# Altium footprint library Connector_PinHeader_1.00mm.PcbLib: 278 footprints (part 1 of 18)
Each footprint in its own frame and in the unit in brackets; x right, y up, seen from the top. Pads: shape width x height; smd on the part's side, far side on the other; paste and mask are expansions set on the pad; w line width, h text height; cw(c..) or ccw(c..) is an arc to the next point about the centre after c.
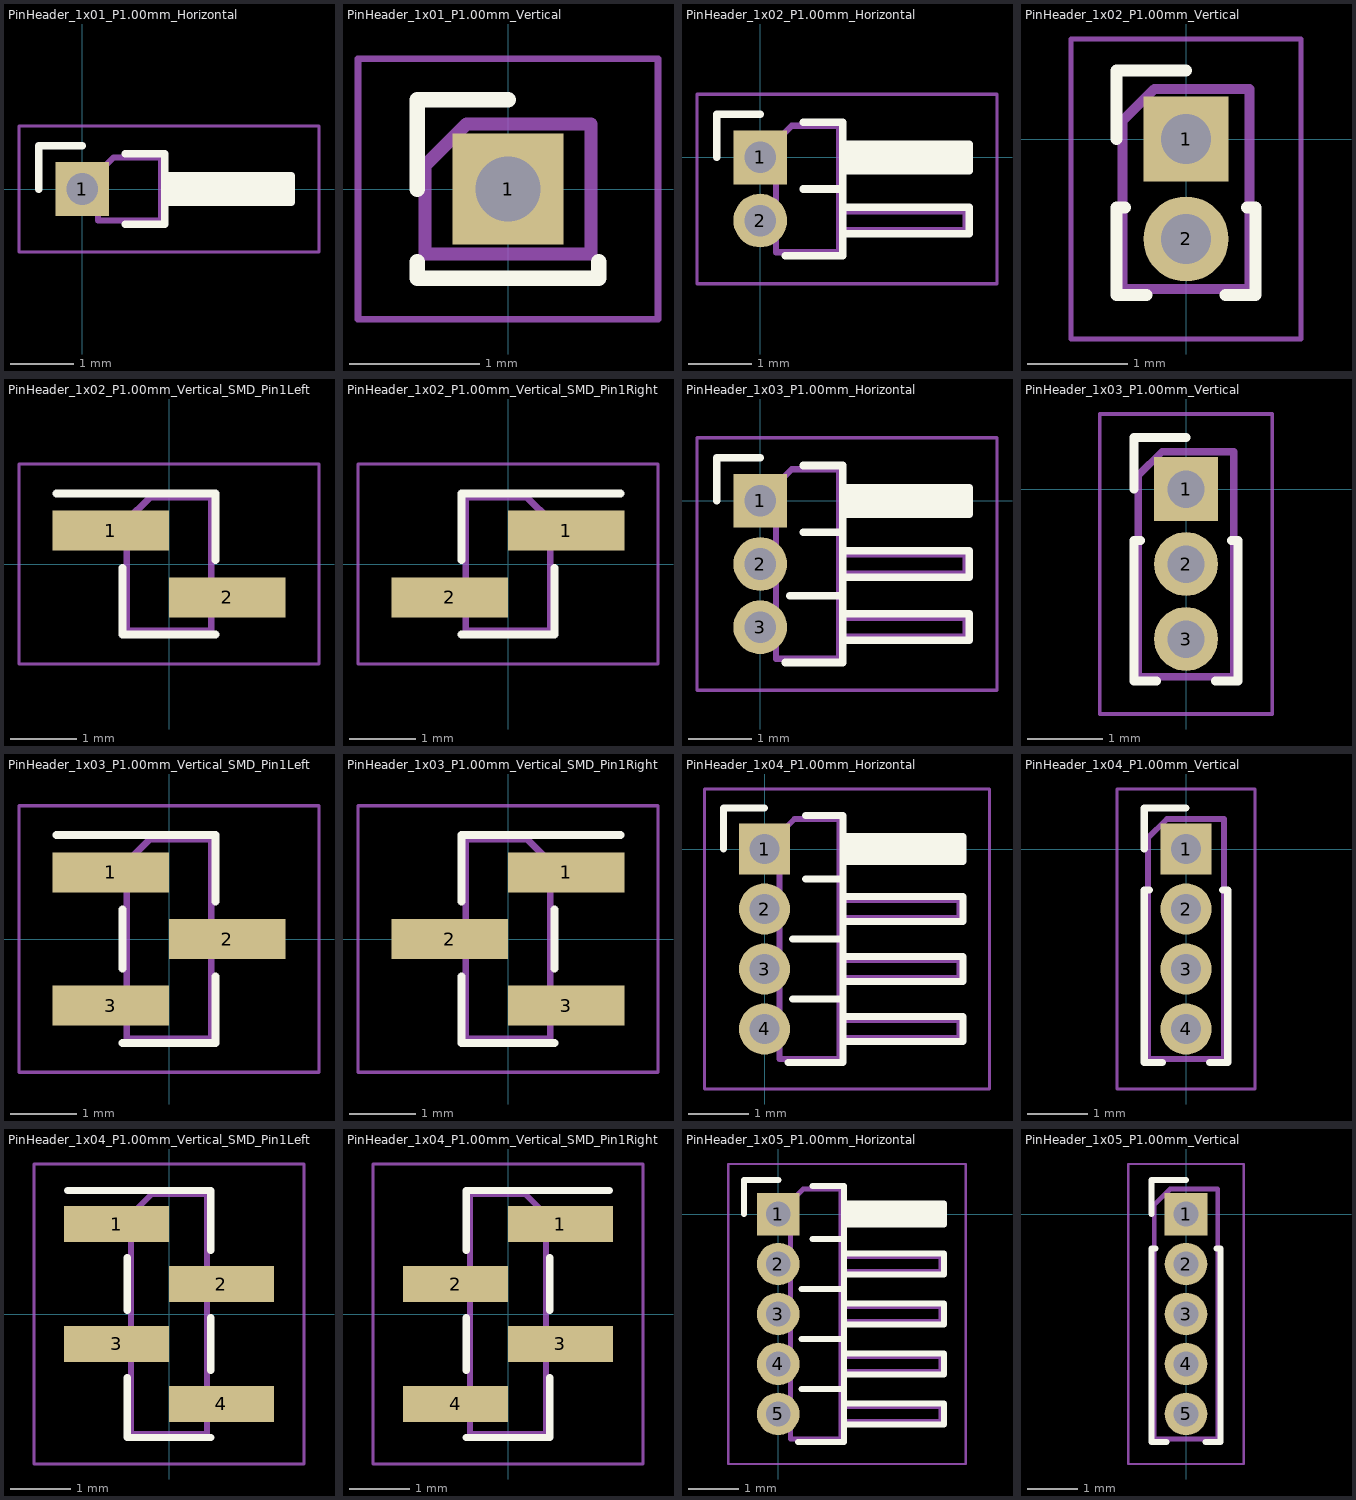
[diagram p0: the footprints below, top view; thin cyan lines are the x and y axes]

## PinHeader_1x01_P1.00mm_Horizontal [mm]
pads (1):
  rect 0.85x0.85 hole 0.5: 1(0,0)
F.SilkS:
  lines w0.12: -0.685,0 -0.685,0.685 0,0.685 ; 0.685,-0.56 1.31,-0.56 1.31,0.56 0.685,0.56 ; 1.31,-0.21 3.31,-0.21 3.31,0.21 1.31,0.21 ; 1.31,-0.09 3.31,-0.09 ; 1.31,0.03 3.31,0.03 ; 1.31,0.15 3.31,0.15
F.CrtYd:
  lines w0.05: -1,-1 -1,1 3.75,1 3.75,-1 -1,-1
F.Fab:
  lines w0.1: 0.25,-0.15 -0.15,-0.15 -0.15,0.15 0.25,0.15 ; 1.25,-0.15 3.25,-0.15 3.25,0.15 1.25,0.15 ; 0.25,-0.5 1.25,-0.5 1.25,0.5 0.5,0.5 0.25,0.25 0.25,-0.5
  text "'.Designator'" at 1.254,-2.428 h0.6

## PinHeader_1x01_P1.00mm_Vertical [mm]
pads (1):
  rect 0.85x0.85 hole 0.5: 1(0,0)
F.SilkS:
  lines w0.12: -0.695,-0.56 -0.695,-0.685 ; -0.695,0 -0.695,0.685 0,0.685 ; -0.608,-0.685 -0.695,-0.685 ; 0.608,-0.685 0.695,-0.685 ; 0.695,-0.56 0.695,-0.685 ; -0.695,-0.685 0.695,-0.685
F.CrtYd:
  lines w0.05: -1.15,-1 1.15,-1 1.15,1 -1.15,1 -1.15,-1
F.Fab:
  lines w0.1: -0.635,-0.5 -0.635,0.182 -0.318,0.5 0.635,0.5 0.635,-0.5 -0.635,-0.5
  text "'.Designator'" at 0.639,-3.076 h0.76

## PinHeader_1x02_P1.00mm_Horizontal [mm]
pads (2):
  rect 0.85x0.85 hole 0.5: 1(0,0)
  rrect100% 0.85x0.85 hole 0.5: 2(0,-1)
F.SilkS:
  lines w0.12: -0.685,0 -0.685,0.685 0,0.685 ; 0.394,-1.56 1.31,-1.56 1.31,0.56 0.685,0.56 ; 0.685,-0.5 1.31,-0.5 ; 1.31,-1.21 3.31,-1.21 3.31,-0.79 1.31,-0.79 ; 1.31,-0.21 3.31,-0.21 3.31,0.21 1.31,0.21 ; 1.31,-0.09 3.31,-0.09 ; 1.31,0.03 3.31,0.03 ; 1.31,0.15 3.31,0.15
F.CrtYd:
  lines w0.05: -1,-2 3.75,-2 3.75,1 -1,1 -1,-2
F.Fab:
  lines w0.1: 0.25,-1.15 -0.15,-1.15 -0.15,-0.85 0.25,-0.85 ; 0.25,-0.15 -0.15,-0.15 -0.15,0.15 0.25,0.15 ; 1.25,-1.15 3.25,-1.15 3.25,-0.85 1.25,-0.85 ; 1.25,-0.15 3.25,-0.15 3.25,0.15 1.25,0.15 ; 0.25,-1.5 1.25,-1.5 1.25,0.5 0.5,0.5 0.25,0.25 0.25,-1.5
  text "'.Designator'" at 1.254,-2.928 h0.6

## PinHeader_1x02_P1.00mm_Vertical [mm]
pads (2):
  rect 0.85x0.85 hole 0.5: 1(0,0)
  rrect100% 0.85x0.85 hole 0.5: 2(0,-1)
F.SilkS:
  lines w0.12: -0.695,0 -0.695,0.685 0,0.685 ; -0.608,-0.685 -0.695,-0.685 -0.695,-1.56 -0.394,-1.56 ; 0.394,-1.56 0.695,-1.56 0.695,-0.685 0.608,-0.685
F.CrtYd:
  lines w0.05: -1.15,-2 -1.15,1 1.15,1 1.15,-2 -1.15,-2
F.Fab:
  lines w0.1: -0.635,-1.5 0.635,-1.5 0.635,0.5 -0.318,0.5 -0.635,0.182 -0.635,-1.5
  text "'.Designator'" at 0.639,-3.576 h0.76

## PinHeader_1x02_P1.00mm_Vertical_SMD_Pin1Left [mm]
pads (2):
  rect 1.75x0.6 smd: 1(-0.875,0.5) 2(0.875,-0.5)
F.SilkS:
  lines w0.12: -1.69,1.06 -0.695,1.06 0.695,1.06 0.695,0.06 ; -0.695,-0.06 -0.695,-1.06 0.695,-1.06
F.CrtYd:
  lines w0.05: -2.25,-1.5 2.25,-1.5 2.25,1.5 -2.25,1.5 -2.25,-1.5
F.Fab:
  lines w0.1: -0.635,0.35 -1.25,0.35 -1.25,0.65 -0.635,0.65 ; 0.635,-0.65 1.25,-0.65 1.25,-0.35 0.635,-0.35 ; -0.635,0.65 -0.285,1 0.635,1 0.635,-1 -0.635,-1 -0.635,0.65
  text "'.Designator'" at 0.84,-4.047 h1

## PinHeader_1x02_P1.00mm_Vertical_SMD_Pin1Right [mm]
pads (2):
  rect 1.75x0.6 smd: 1(0.875,0.5) 2(-0.875,-0.5)
F.SilkS:
  lines w0.12: -0.695,-1.06 0.695,-1.06 0.695,-0.06 ; -0.695,0.94 -0.695,0.06 -0.695,1.06 0.695,1.06 1.69,1.06
F.CrtYd:
  lines w0.05: -2.25,-1.5 -2.25,1.5 2.25,1.5 2.25,-1.5 -2.25,-1.5
F.Fab:
  lines w0.1: -0.635,-0.65 -1.25,-0.65 -1.25,-0.35 -0.635,-0.35 ; 0.635,0.35 1.25,0.35 1.25,0.65 0.635,0.65 ; 0.635,0.65 0.635,-1 -0.635,-1 -0.635,1 0.285,1 0.635,0.65
  text "'.Designator'" at 0.84,-4.047 h1

## PinHeader_1x03_P1.00mm_Horizontal [mm]
pads (3):
  rect 0.85x0.85 hole 0.5: 1(0,0)
  rrect100% 0.85x0.85 hole 0.5: 2(0,-1) 3(0,-2)
F.SilkS:
  lines w0.12: -0.685,0 -0.685,0.685 0,0.685 ; 0.394,-2.56 1.31,-2.56 1.31,0.56 0.685,0.56 ; 0.468,-1.5 1.31,-1.5 ; 0.685,-0.5 1.31,-0.5 ; 1.31,-2.21 3.31,-2.21 3.31,-1.79 1.31,-1.79 ; 1.31,-1.21 3.31,-1.21 3.31,-0.79 1.31,-0.79 ; 1.31,-0.21 3.31,-0.21 3.31,0.21 1.31,0.21 ; 1.31,-0.09 3.31,-0.09 ; 1.31,0.03 3.31,0.03 ; 1.31,0.15 3.31,0.15
F.CrtYd:
  lines w0.05: -1,-3 3.75,-3 3.75,1 -1,1 -1,-3
F.Fab:
  lines w0.1: 0.25,-2.15 -0.15,-2.15 -0.15,-1.85 0.25,-1.85 ; 0.25,-1.15 -0.15,-1.15 -0.15,-0.85 0.25,-0.85 ; 0.25,-0.15 -0.15,-0.15 -0.15,0.15 0.25,0.15 ; 1.25,-2.15 3.25,-2.15 3.25,-1.85 1.25,-1.85 ; 1.25,-1.15 3.25,-1.15 3.25,-0.85 1.25,-0.85 ; 1.25,-0.15 3.25,-0.15 3.25,0.15 1.25,0.15 ; 0.25,-2.5 1.25,-2.5 1.25,0.5 0.5,0.5 0.25,0.25 0.25,-2.5
  text "'.Designator'" at 1.254,-3.428 h0.6

## PinHeader_1x03_P1.00mm_Vertical [mm]
pads (3):
  rect 0.85x0.85 hole 0.5: 1(0,0)
  rrect100% 0.85x0.85 hole 0.5: 2(0,-1) 3(0,-2)
F.SilkS:
  lines w0.12: -0.695,0 -0.695,0.685 0,0.685 ; -0.608,-0.685 -0.695,-0.685 -0.695,-2.56 -0.394,-2.56 ; 0.394,-2.56 0.695,-2.56 0.695,-0.685 0.608,-0.685
F.CrtYd:
  lines w0.05: -1.15,-3 -1.15,1 1.15,1 1.15,-3 -1.15,-3
F.Fab:
  lines w0.1: -0.635,-2.5 0.635,-2.5 0.635,0.5 -0.318,0.5 -0.635,0.182 -0.635,-2.5
  text "'.Designator'" at 0.639,-4.076 h0.76

## PinHeader_1x03_P1.00mm_Vertical_SMD_Pin1Left [mm]
pads (3):
  rect 1.75x0.6 smd: 1(-0.875,1) 2(0.875,0) 3(-0.875,-1)
F.SilkS:
  lines w0.12: -1.69,1.56 -0.695,1.56 0.695,1.56 0.695,0.56 ; -0.695,-1.56 0.695,-1.56 0.695,-0.56 ; -0.695,-0.44 -0.695,0.44
F.CrtYd:
  lines w0.05: -2.25,-2 -2.25,2 2.25,2 2.25,-2 -2.25,-2
F.Fab:
  lines w0.1: -0.635,-1.15 -1.25,-1.15 -1.25,-0.85 -0.635,-0.85 ; -0.635,0.85 -1.25,0.85 -1.25,1.15 -0.635,1.15 ; 0.635,-0.15 1.25,-0.15 1.25,0.15 0.635,0.15 ; -0.635,1.15 -0.635,-1.5 0.635,-1.5 0.635,1.5 -0.285,1.5 -0.635,1.15
  text "'.Designator'" at 0.84,-4.047 h1

## PinHeader_1x03_P1.00mm_Vertical_SMD_Pin1Right [mm]
pads (3):
  rect 1.75x0.6 smd: 1(0.875,1) 2(-0.875,0) 3(0.875,-1)
F.SilkS:
  lines w0.12: -0.695,-0.56 -0.695,-1.56 0.695,-1.56 ; -0.695,1.44 -0.695,0.56 -0.695,1.56 0.695,1.56 1.69,1.56 ; 0.695,-0.44 0.695,0.44
F.CrtYd:
  lines w0.05: -2.25,-2 2.25,-2 2.25,2 -2.25,2 -2.25,-2
F.Fab:
  lines w0.1: -0.635,-0.15 -1.25,-0.15 -1.25,0.15 -0.635,0.15 ; 0.635,-1.15 1.25,-1.15 1.25,-0.85 0.635,-0.85 ; 0.635,0.85 1.25,0.85 1.25,1.15 0.635,1.15 ; 0.635,1.15 0.285,1.5 -0.635,1.5 -0.635,-1.5 0.635,-1.5 0.635,1.15
  text "'.Designator'" at 0.84,-4.047 h1

## PinHeader_1x04_P1.00mm_Horizontal [mm]
pads (4):
  rect 0.85x0.85 hole 0.5: 1(0,0)
  rrect100% 0.85x0.85 hole 0.5: 2(0,-1) 3(0,-2) 4(0,-3)
F.SilkS:
  lines w0.12: -0.685,0 -0.685,0.685 0,0.685 ; 0.394,-3.56 1.31,-3.56 1.31,0.56 0.685,0.56 ; 0.468,-2.5 1.31,-2.5 ; 0.468,-1.5 1.31,-1.5 ; 0.685,-0.5 1.31,-0.5 ; 1.31,-3.21 3.31,-3.21 3.31,-2.79 1.31,-2.79 ; 1.31,-2.21 3.31,-2.21 3.31,-1.79 1.31,-1.79 ; 1.31,-1.21 3.31,-1.21 3.31,-0.79 1.31,-0.79 ; 1.31,-0.21 3.31,-0.21 3.31,0.21 1.31,0.21 ; 1.31,-0.09 3.31,-0.09 ; 1.31,0.03 3.31,0.03 ; 1.31,0.15 3.31,0.15
F.CrtYd:
  lines w0.05: -1,-4 -1,1 3.75,1 3.75,-4 -1,-4
F.Fab:
  lines w0.1: 0.25,-3.15 -0.15,-3.15 -0.15,-2.85 0.25,-2.85 ; 0.25,-2.15 -0.15,-2.15 -0.15,-1.85 0.25,-1.85 ; 0.25,-1.15 -0.15,-1.15 -0.15,-0.85 0.25,-0.85 ; 0.25,-0.15 -0.15,-0.15 -0.15,0.15 0.25,0.15 ; 1.25,-3.15 3.25,-3.15 3.25,-2.85 1.25,-2.85 ; 1.25,-2.15 3.25,-2.15 3.25,-1.85 1.25,-1.85 ; 1.25,-1.15 3.25,-1.15 3.25,-0.85 1.25,-0.85 ; 1.25,-0.15 3.25,-0.15 3.25,0.15 1.25,0.15 ; 0.25,-3.5 1.25,-3.5 1.25,0.5 0.5,0.5 0.25,0.25 0.25,-3.5
  text "'.Designator'" at 1.254,-3.928 h0.6

## PinHeader_1x04_P1.00mm_Vertical [mm]
pads (4):
  rect 0.85x0.85 hole 0.5: 1(0,0)
  rrect100% 0.85x0.85 hole 0.5: 2(0,-1) 3(0,-2) 4(0,-3)
F.SilkS:
  lines w0.12: -0.695,0 -0.695,0.685 0,0.685 ; -0.608,-0.685 -0.695,-0.685 -0.695,-3.56 -0.394,-3.56 ; 0.394,-3.56 0.695,-3.56 0.695,-0.685 0.608,-0.685
F.CrtYd:
  lines w0.05: -1.15,-4 -1.15,1 1.15,1 1.15,-4 -1.15,-4
F.Fab:
  lines w0.1: -0.635,-3.5 -0.635,0.182 -0.318,0.5 0.635,0.5 0.635,-3.5 -0.635,-3.5
  text "'.Designator'" at 0.639,-4.576 h0.76

## PinHeader_1x04_P1.00mm_Vertical_SMD_Pin1Left [mm]
pads (4):
  rect 1.75x0.6 smd: 1(-0.875,1.5) 2(0.875,0.5) 3(-0.875,-0.5) 4(0.875,-1.5)
F.SilkS:
  lines w0.12: -1.69,2.06 -0.695,2.06 0.695,2.06 0.695,1.06 ; -0.695,-1.06 -0.695,-2.06 0.695,-2.06 ; -0.695,0.06 -0.695,0.94 ; 0.695,-0.94 0.695,-0.06
F.CrtYd:
  lines w0.05: -2.25,-2.5 2.25,-2.5 2.25,2.5 -2.25,2.5 -2.25,-2.5
F.Fab:
  lines w0.1: -0.635,-0.65 -1.25,-0.65 -1.25,-0.35 -0.635,-0.35 ; -0.635,1.35 -1.25,1.35 -1.25,1.65 -0.635,1.65 ; 0.635,-1.65 1.25,-1.65 1.25,-1.35 0.635,-1.35 ; 0.635,0.35 1.25,0.35 1.25,0.65 0.635,0.65 ; -0.635,1.65 -0.635,-2 0.635,-2 0.635,2 -0.285,2 -0.635,1.65
  text "'.Designator'" at 0.84,-4.047 h1

## PinHeader_1x04_P1.00mm_Vertical_SMD_Pin1Right [mm]
pads (4):
  rect 1.75x0.6 smd: 1(0.875,1.5) 2(-0.875,0.5) 3(0.875,-0.5) 4(-0.875,-1.5)
F.SilkS:
  lines w0.12: -0.695,-2.06 0.695,-2.06 0.695,-1.06 ; -0.695,-0.94 -0.695,-0.06 ; -0.695,1.94 -0.695,1.06 -0.695,2.06 0.695,2.06 1.69,2.06 ; 0.695,0.06 0.695,0.94
F.CrtYd:
  lines w0.05: -2.25,-2.5 2.25,-2.5 2.25,2.5 -2.25,2.5 -2.25,-2.5
F.Fab:
  lines w0.1: -0.635,-1.65 -1.25,-1.65 -1.25,-1.35 -0.635,-1.35 ; -0.635,0.35 -1.25,0.35 -1.25,0.65 -0.635,0.65 ; 0.635,-0.65 1.25,-0.65 1.25,-0.35 0.635,-0.35 ; 0.635,1.35 1.25,1.35 1.25,1.65 0.635,1.65 ; 0.635,1.65 0.635,-2 -0.635,-2 -0.635,2 0.285,2 0.635,1.65
  text "'.Designator'" at 0.84,-4.047 h1

## PinHeader_1x05_P1.00mm_Horizontal [mm]
pads (5):
  rect 0.85x0.85 hole 0.5: 1(0,0)
  rrect100% 0.85x0.85 hole 0.5: 2(0,-1) 3(0,-2) 4(0,-3) 5(0,-4)
F.SilkS:
  lines w0.12: -0.685,0 -0.685,0.685 0,0.685 ; 0.394,-4.56 1.31,-4.56 1.31,0.56 0.685,0.56 ; 0.468,-3.5 1.31,-3.5 ; 0.468,-2.5 1.31,-2.5 ; 0.468,-1.5 1.31,-1.5 ; 0.685,-0.5 1.31,-0.5 ; 1.31,-4.21 3.31,-4.21 3.31,-3.79 1.31,-3.79 ; 1.31,-3.21 3.31,-3.21 3.31,-2.79 1.31,-2.79 ; 1.31,-2.21 3.31,-2.21 3.31,-1.79 1.31,-1.79 ; 1.31,-1.21 3.31,-1.21 3.31,-0.79 1.31,-0.79 ; 1.31,-0.21 3.31,-0.21 3.31,0.21 1.31,0.21 ; 1.31,-0.09 3.31,-0.09 ; 1.31,0.03 3.31,0.03 ; 1.31,0.15 3.31,0.15
F.CrtYd:
  lines w0.05: -1,-5 3.75,-5 3.75,1 -1,1 -1,-5
F.Fab:
  lines w0.1: 0.25,-4.15 -0.15,-4.15 -0.15,-3.85 0.25,-3.85 ; 0.25,-3.15 -0.15,-3.15 -0.15,-2.85 0.25,-2.85 ; 0.25,-2.15 -0.15,-2.15 -0.15,-1.85 0.25,-1.85 ; 0.25,-1.15 -0.15,-1.15 -0.15,-0.85 0.25,-0.85 ; 0.25,-0.15 -0.15,-0.15 -0.15,0.15 0.25,0.15 ; 1.25,-4.15 3.25,-4.15 3.25,-3.85 1.25,-3.85 ; 1.25,-3.15 3.25,-3.15 3.25,-2.85 1.25,-2.85 ; 1.25,-2.15 3.25,-2.15 3.25,-1.85 1.25,-1.85 ; 1.25,-1.15 3.25,-1.15 3.25,-0.85 1.25,-0.85 ; 1.25,-0.15 3.25,-0.15 3.25,0.15 1.25,0.15 ; 0.25,-4.5 0.25,0.25 0.5,0.5 1.25,0.5 1.25,-4.5 0.25,-4.5
  text "'.Designator'" at 1.254,-4.428 h0.6

## PinHeader_1x05_P1.00mm_Vertical [mm]
pads (5):
  rect 0.85x0.85 hole 0.5: 1(0,0)
  rrect100% 0.85x0.85 hole 0.5: 2(0,-1) 3(0,-2) 4(0,-3) 5(0,-4)
F.SilkS:
  lines w0.12: -0.695,0 -0.695,0.685 0,0.685 ; -0.608,-0.685 -0.695,-0.685 -0.695,-4.56 -0.394,-4.56 ; 0.394,-4.56 0.695,-4.56 0.695,-0.685 0.608,-0.685
F.CrtYd:
  lines w0.05: -1.15,-5 1.15,-5 1.15,1 -1.15,1 -1.15,-5
F.Fab:
  lines w0.1: -0.635,-4.5 -0.635,0.182 -0.318,0.5 0.635,0.5 0.635,-4.5 -0.635,-4.5
  text "'.Designator'" at 0.639,-5.076 h0.76